# Altium footprint library pcblib_AGVcontrol.PcbLib: 34 footprints (part 3 of 3)
Each footprint in its own frame and in the unit in brackets; x right, y up, seen from the top. Pads: shape width x height; smd on the part's side, far side on the other; paste and mask are expansions set on the pad; w line width, h text height; cw(c..) or ccw(c..) is an arc to the next point about the centre after c.
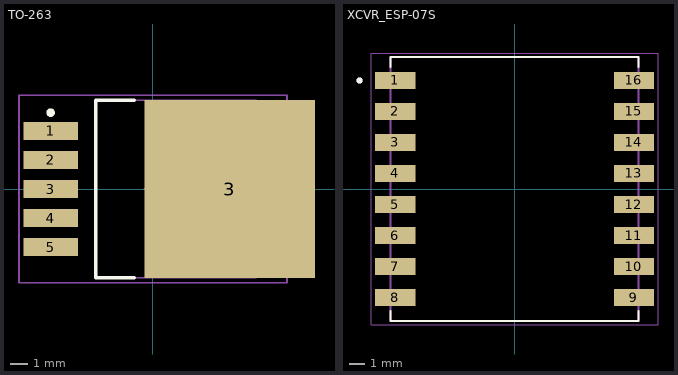
[diagram p2: the footprints below, top view; thin cyan lines are the x and y axes]

## TO-263 [mm] "LM2576"
pads (6):
  rect 3.2x1.05 smd: 1(-6,3.4) 2(-6,1.7) 3(-6,0) 4(-6,-1.7) 5(-6,-3.4)
  rect 10x10.45 smd: 3(4.5,0)
Top Overlay:
  circle w0.25: c-6,4.475 r0.125
  lines w0.2: -1.1,-5.2 -3.35,-5.2 -3.35,5.2 -1.1,5.2
Mechanical 13:
  lines w0.1: -3.35,-5.2 -3.35,5.2 6.05,5.2 6.05,-5.2 -3.35,-5.2
Mechanical 15:
  lines w0.1: -0.5,0 0.5,0 ; 0,-0.5 0,0.5 ; -7.85,-5.5 -7.85,5.5 7.85,5.5 7.85,-5.5 -7.85,-5.5
3D body: height 0.5, standoff 0, extent 6.05,-5.2 7.569,5.2
3D body: height 0.5, standoff 0, extent -6.566,-3.95 -4.305,-2.857
3D body: height 2, standoff 0, extent -4.953,-3.95 -4.293,-2.857
3D body: height 2, standoff 1.5, extent -4.953,-3.937 -3.251,-2.845
3D body: height 0.5, standoff 0, extent -6.54,-0.597 -4.28,0.495
3D body: height 2, standoff 0, extent -4.928,-0.597 -4.267,0.495
3D body: height 2, standoff 1.5, extent -4.928,-0.584 -3.226,0.508
3D body: height 2, standoff 1.5, extent -4.94,-2.273 -3.238,-1.181
3D body: height 2, standoff 0, extent -4.94,-2.286 -4.28,-1.194
3D body: height 0.5, standoff 0, extent -6.553,-2.286 -4.293,-1.194
3D body: height 0.5, standoff 0, extent -6.579,1.143 -4.318,2.235
3D body: height 2, standoff 0, extent -4.966,1.143 -4.305,2.235
3D body: height 2, standoff 1.5, extent -4.966,1.156 -3.264,2.248
3D body: height 2, standoff 1.5, extent -4.953,2.845 -3.251,3.937
3D body: height 2, standoff 0, extent -4.953,2.832 -4.293,3.924
3D body: height 0.5, standoff 0, extent -6.566,2.832 -4.305,3.924
3D body: height 4.65, standoff 0, extent -3.35,-5.2 6.05,5.2

## XCVR_ESP-07S [mm]
height 3
pads (16):
  rect 2.6x1.1 smd: 1(-7.7,7) 2(-7.7,5) 3(-7.7,3) 4(-7.7,1) 5(-7.7,-1) 6(-7.7,-3) 7(-7.7,-5) 8(-7.7,-7) 9(7.7,-7) 10(7.7,-5) 11(7.7,-3) 12(7.7,-1) 13(7.7,1) 14(7.7,3) 15(7.7,5) 16(7.7,7)
Top Overlay:
  circle w0.2: c-10,7 r0.1
  lines w0.127: -8,-7.87 -8,-8.5 8,-8.5 8,-7.87 ; -8,7.87 -8,8.5 8,8.5 8,7.87
Mechanical 13:
  circle w0.2: c-10,7 r0.1
  lines w0.127: -8,-8.5 8,-8.5 8,8.5 -8,8.5 -8,-8.5
Mechanical 15:
  lines w0.05: -9.25,-8.75 9.25,-8.75 9.25,8.75 -9.25,8.75 -9.25,-8.75
3D body "step_temp.STEP": height 3, standoff 0, extent -8,-8.5 8,8.5